# Altium footprint library 封装库.PcbLib: 755 footprints (part 31 of 48)
Each footprint in its own frame and in the unit in brackets; x right, y up, seen from the top. Pads: shape width x height; smd on the part's side, far side on the other; paste and mask are expansions set on the pad; w line width, h text height; cw(c..) or ccw(c..) is an arc to the next point about the centre after c.
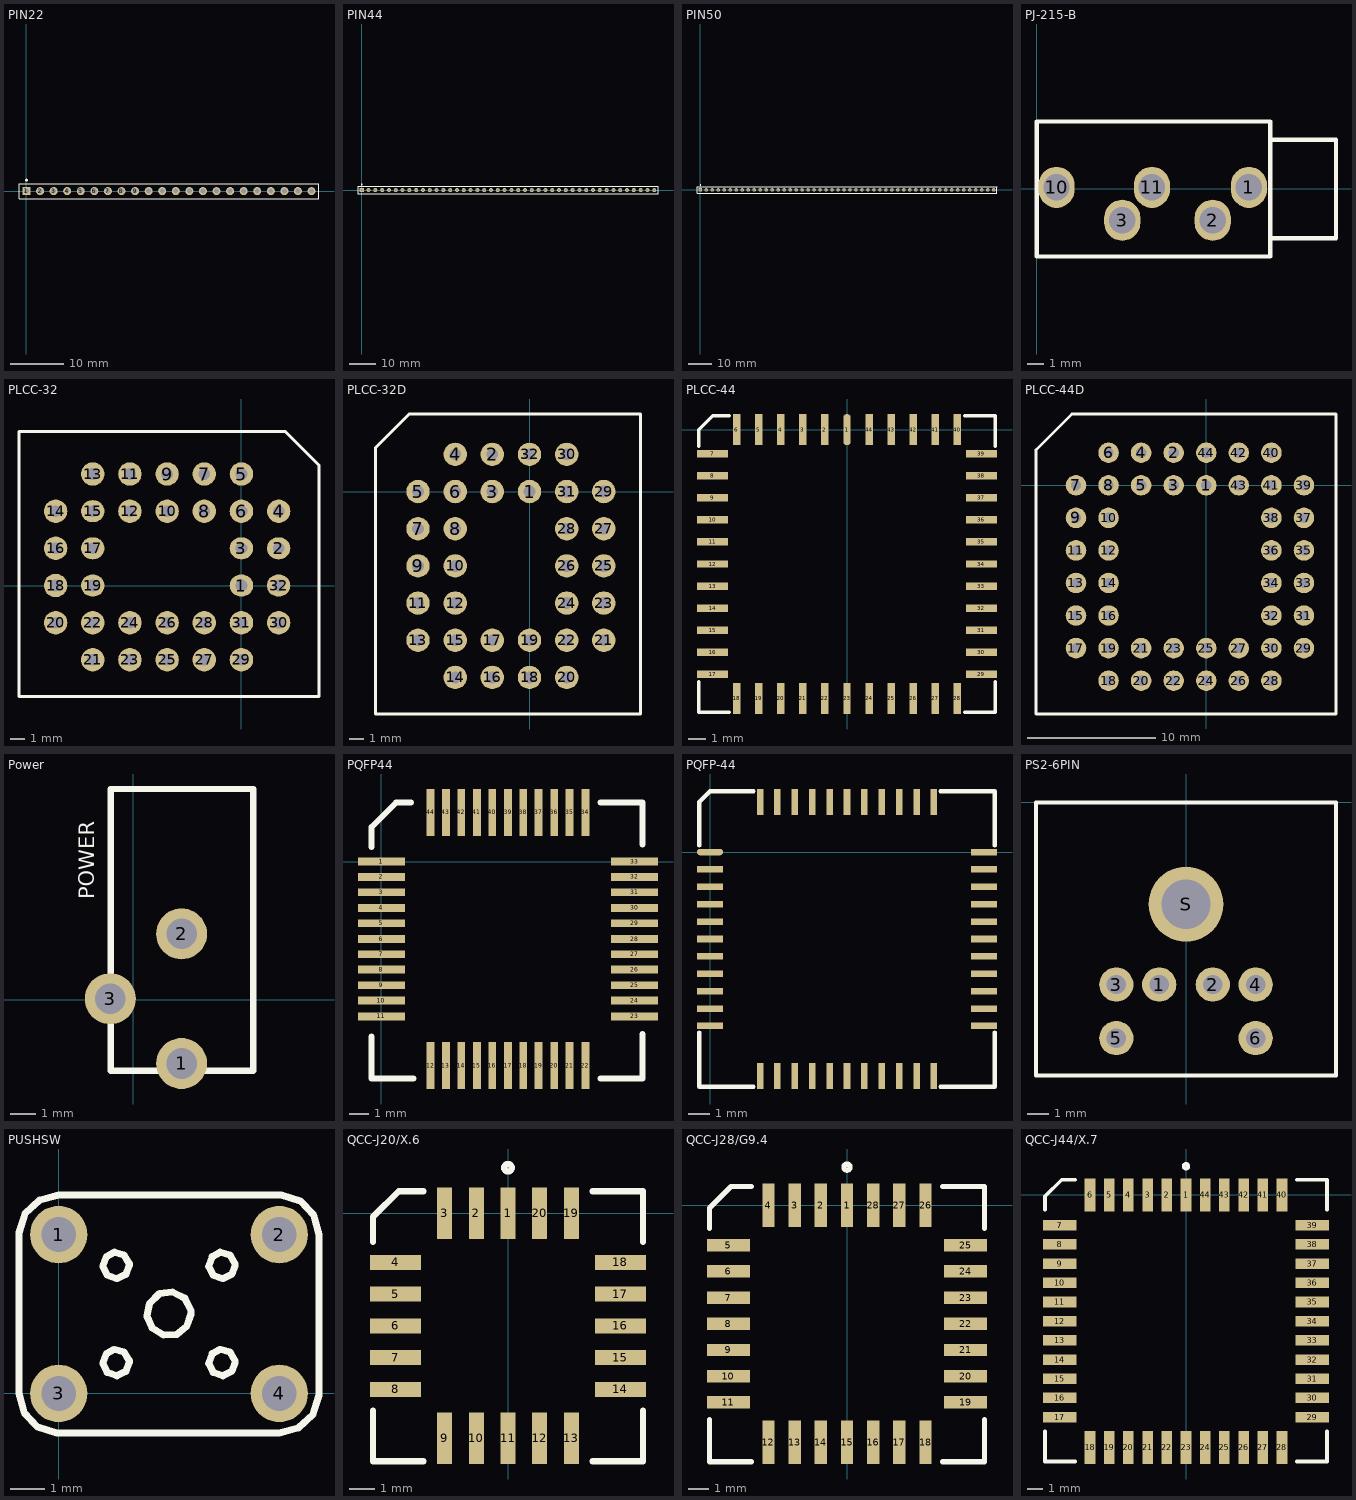
[diagram p30: the footprints below, top view; thin cyan lines are the x and y axes]

## PIN22 [mm] "Connector; Edge; 22 Position"
pads (22):
  rect 1.5x1.5 hole 0.9: 1(0,0)
  round 1.5 hole 0.9: 2(2.54,0) 3(5.08,0) 4(7.62,0) 5(10.16,0) 6(12.7,0) 7(15.24,0) 8(17.78,0) 10(22.86,0) 11(25.4,0) 12(27.94,0) 13(30.48,0) 14(33.02,0) 15(35.56,0) 16(38.1,0) 17(40.64,0) 18(43.18,0) 19(45.72,0) 20(48.26,0) 21(50.8,0) 22(53.34,0)
  oval 1.51x1.5 hole 0.9: 9(20.32,0)
Top Overlay:
  circle w0.25: c0,2.05 r0.125
  lines w0.2: -1.4,-1.4 54.74,-1.4 54.74,1.4 -1.4,1.4 -1.4,-1.4

## PIN44 [mm] "Connector; Edge; 44 Position"
pads (44):
  rect 1.5x1.5 hole 0.9: 1(0,0)
  round 1.5 hole 0.9: 2(2.54,0) 3(5.08,0) 4(7.62,0) 5(10.16,0) 6(12.7,0) 7(15.24,0) 8(17.78,0) 10(22.86,0) 11(25.4,0) 12(27.94,0) 13(30.48,0) 14(33.02,0) 15(35.56,0) 16(38.1,0) 17(40.64,0) 18(43.18,0) 19(45.72,0) 20(48.26,0) 21(50.8,0) 22(53.34,0) 23(55.88,0) 24(58.42,0) 25(60.96,0) 26(63.5,0) 27(66.04,0) 28(68.58,0) 29(71.12,0) 30(73.66,0) 31(76.2,0) 32(78.74,0) 33(81.28,0) 34(83.82,0) 35(86.36,0) 36(88.9,0) 37(91.44,0) 38(93.98,0) 39(96.52,0) 40(99.06,0) 41(101.6,0) 42(104.14,0) 43(106.68,0) 44(109.22,0)
  oval 1.51x1.5 hole 0.9: 9(20.32,0)
Top Overlay:
  circle w0.25: c0,2.05 r0.125
  lines w0.2: -1.4,-1.4 110.62,-1.4 110.62,1.4 -1.4,1.4 -1.4,-1.4

## PIN50 [mm] "Connector; Edge; 50 Position"
pads (50):
  rect 1.5x1.5 hole 0.9: 1(0,0)
  round 1.5 hole 0.9: 2(2.54,0) 3(5.08,0) 4(7.62,0) 5(10.16,0) 6(12.7,0) 7(15.24,0) 8(17.78,0) 9(20.32,0) 10(22.86,0) 11(25.4,0) 12(27.94,0) 13(30.48,0) 14(33.02,0) 15(35.56,0) 16(38.1,0) 17(40.64,0) 18(43.18,0) 19(45.72,0) 20(48.26,0) 22(53.34,0) 23(55.88,0) 24(58.42,0) 25(60.96,0) 26(63.5,0) 27(66.04,0) 28(68.58,0) 29(71.12,0) 30(73.66,0) 31(76.2,0) 32(78.74,0) 33(81.28,0) 34(83.82,0) 35(86.36,0) 36(88.9,0) 37(91.44,0) 38(93.98,0) 39(96.52,0) 40(99.06,0) 41(101.6,0) 42(104.14,0) 43(106.68,0) 44(109.22,0) 45(111.76,0) 46(114.3,0) 47(116.84,0) 48(119.38,0) 49(121.92,0) 50(124.46,0)
  oval 1.51x1.5 hole 0.9: 21(50.8,0)
Top Overlay:
  circle w0.25: c0,2.05 r0.125
  lines w0.2: -1.4,-1.4 -1.4,1.4 125.86,1.4 125.86,-1.4 -1.4,-1.4

## PJ-215-B [mm]
pads (5):
  oval 2.2x2.5 hole 1.6: 1(12.907,0.089) 2(10.707,-1.911) 3(5.207,-1.911) 10(1.207,0.089) 11(7.007,0.089)
Top Overlay:
  lines w0.254: 14.207,-3.011 18.207,-3.011 18.207,2.989 14.207,2.989 ; 0.007,-4.111 0.007,4.089 14.207,4.089 14.207,-4.111 0.007,-4.111

## PLCC-32 [mm]
pads (32):
  oval 1.6x1.5 hole 0.8: 1(0,0) 2(2.54,2.54) 3(0,2.54) 15(-10.16,5.08) 17(-10.16,2.54) 19(-10.16,0) 32(2.54,0)
  round 1.6 hole 0.8: 4(2.54,5.08) 5(0,7.62) 6(0,5.08) 7(-2.54,7.62) 8(-2.54,5.08) 9(-5.08,7.62) 10(-5.08,5.08) 11(-7.62,7.62) 12(-7.62,5.08) 13(-10.16,7.62) 14(-12.7,5.08) 16(-12.7,2.54) 18(-12.7,0) 20(-12.7,-2.54) 21(-10.16,-5.08) 22(-10.16,-2.54) 23(-7.62,-5.08) 24(-7.62,-2.54) 25(-5.08,-5.08) 26(-5.08,-2.54) 27(-2.54,-5.08) 28(-2.54,-2.54) 29(0,-5.08) 30(2.54,-2.54) 31(0,-2.54)
Top Overlay:
  lines w0.2: -15.2,-7.58 -15.2,10.52 3,10.52 3.1,10.42 5.3,8.22 5.3,-7.58 -15.2,-7.58

## PLCC-32D [mm]
pads (32):
  round 1.6 hole 0.8: 1(0,0) 2(-2.54,2.54) 3(-2.54,0) 4(-5.08,2.54) 5(-7.62,0) 6(-5.08,0) 7(-7.62,-2.54) 8(-5.08,-2.54) 9(-7.62,-5.08) 10(-5.08,-5.08) 11(-7.62,-7.62) 12(-5.08,-7.62) 13(-7.62,-10.16) 14(-5.08,-12.7) 15(-5.08,-10.16) 16(-2.54,-12.7) 17(-2.54,-10.16) 18(0,-12.7) 19(0,-10.16) 20(2.54,-12.7) 21(5.08,-10.16) 22(2.54,-10.16) 23(5.08,-7.62) 24(2.54,-7.62) 25(5.08,-5.08) 26(2.54,-5.08) 27(5.08,-2.54) 28(2.54,-2.54) 29(5.08,0) 30(2.54,2.54) 31(2.54,0) 32(0,2.54)
Top Overlay:
  lines w0.2: -10.52,-15.2 -10.52,3 -10.42,3.1 -8.22,5.3 7.58,5.3 7.58,-15.2 -10.52,-15.2

## PLCC-44 [mil] "stc"
pads (44):
  oval 17.01x70.87 smd: 1(0,0)
  rect 17.01x70.87 smd: 2(-50,0) 3(-100,0) 4(-150,0) 5(-200,0) 6(-250,0) 18(-250,-610) 19(-200,-610) 20(-150,-610) 21(-100,-610) 22(-50,-610) 23(0,-610) 24(50,-610) 25(100,-610) 26(150,-610) 27(200,-610) 28(250,-610) 40(250,0) 41(200,0) 42(150,0) 43(100,0) 44(50,0)
  rect 70.87x17.01 smd: 7(-305,-55) 8(-305,-105) 9(-305,-155) 10(-305,-205) 11(-305,-255) 12(-305,-305) 13(-305,-355) 14(-305,-405) 15(-305,-455) 16(-305,-505) 17(-305,-555) 29(305,-555) 30(305,-505) 31(305,-455) 32(305,-405) 33(305,-355) 34(305,-305) 35(305,-255) 36(305,-205) 37(305,-155) 38(305,-105) 39(305,-55)
Top Overlay:
  lines w7.87: -336.5,-572.01 -336.5,-641.5 -267.01,-641.5 ; -336.5,-37.99 -336.5,0 -305,31.5 -267.01,31.5 ; 267.01,-641.5 336.5,-641.5 336.5,-572.01 ; 267.01,31.5 336.5,31.5 336.5,-37.99

## PLCC-44D [mm]
pads (44):
  round 1.6 hole 0.8: 1(0,0) 2(-2.54,2.54) 3(-2.54,0) 4(-5.08,2.54) 5(-5.08,0) 6(-7.62,2.54) 7(-10.16,0) 8(-7.62,0) 9(-10.16,-2.54) 10(-7.62,-2.54) 11(-10.16,-5.08) 12(-7.62,-5.08) 13(-10.16,-7.62) 14(-7.62,-7.62) 15(-10.16,-10.16) 16(-7.62,-10.16) 17(-10.16,-12.7) 18(-7.62,-15.24) 19(-7.62,-12.7) 20(-5.08,-15.24) 21(-5.08,-12.7) 22(-2.54,-15.24) 23(-2.54,-12.7) 24(0,-15.24) 25(0,-12.7) 26(2.54,-15.24) 27(2.54,-12.7) 28(5.08,-15.24) 29(7.62,-12.7) 30(5.08,-12.7) 31(7.62,-10.16) 32(5.08,-10.16) 33(7.62,-7.62) 34(5.08,-7.62) 35(7.62,-5.08) 36(5.08,-5.08) 37(7.62,-2.54) 38(5.08,-2.54) 39(7.62,0) 40(5.08,2.54) 41(5.08,0) 42(2.54,2.54) 43(2.54,0) 44(0,2.54)
Top Overlay:
  lines w0.2: -13.28,-17.84 -13.28,2.76 -10.48,5.56 10.12,5.56 10.12,-17.84 -13.28,-17.84

## Power [mm]
height 1.73
pads (3):
  round 2 hole 1.2: 1(1.893,-2.503) 2(1.893,2.577) 3(-0.901,0.037)
Bottom Layer:
  lines w0.2: 1.67,-2.28 1.893,-2.503
Top Overlay:
  lines w0.254: -0.889,-2.794 4.699,-2.794 4.699,8.255 -0.889,8.255 -0.889,-2.794
  text "POWER" at -1.524,3.937 h0.6

## PQFP44 [mil]
pads (44):
  rect 95x16 smd: 1(0,0) 2(0,-31) 3(0,-62) 4(0,-94) 5(0,-125) 6(0,-157) 7(0,-188) 8(0,-219) 9(0,-251) 10(0,-282) 11(0,-314) 23(514,-314) 24(514,-282) 25(514,-251) 26(514,-219) 27(514,-188) 28(514,-157) 29(514,-125) 30(514,-94) 31(514,-62) 32(514,-31) 33(514,0)
  rect 16x95 smd: 12(100,-414) 13(131,-414) 14(162,-414) 15(194,-414) 16(225,-414) 17(257,-414) 18(288,-414) 19(319,-414) 20(351,-414) 21(382,-414) 22(414,-414) 34(414,100) 35(382,100) 36(351,100) 37(319,100) 38(288,100) 39(257,100) 40(225,100) 41(194,100) 42(162,100) 43(131,100) 44(100,100)
Top Overlay:
  lines w12: -20,-355 -20,-440 65,-440 ; -20,30 -20,70 30,120 60,120 ; 445,-440 530,-440 530,-350 ; 445,120 530,120 530,35

## PQFP-44 [mm] "stc"
pads (44):
  oval 1.2x0.3 smd: 1(0,0)
  rect 1.2x0.3 smd: 2(0,-0.8) 3(0,-1.6) 4(0,-2.4) 5(0,-3.2) 6(0,-4) 7(0,-4.8) 8(0,-5.6) 9(0,-6.4) 10(0,-7.2) 11(0,-8) 23(12.6,-8) 24(12.6,-7.2) 25(12.6,-6.4) 26(12.6,-5.6) 27(12.6,-4.8) 28(12.6,-4) 29(12.6,-3.2) 30(12.6,-2.4) 31(12.6,-1.6) 32(12.6,-0.8) 33(12.6,0)
  rect 0.3x1.2 smd: 12(2.3,-10.3) 13(3.1,-10.3) 14(3.9,-10.3) 15(4.7,-10.3) 16(5.5,-10.3) 17(6.3,-10.3) 18(7.1,-10.3) 19(7.9,-10.3) 20(8.7,-10.3) 21(9.5,-10.3) 22(10.3,-10.3) 34(10.3,2.3) 35(9.5,2.3) 36(8.7,2.3) 37(7.9,2.3) 38(7.1,2.3) 39(6.3,2.3) 40(5.5,2.3) 41(4.7,2.3) 42(3.9,2.3) 43(3.1,2.3) 44(2.3,2.3)
Top Overlay:
  lines w0.2: -0.5,-8.3 -0.5,-10.8 2,-10.8 ; -0.5,0.3 -0.5,2.3 0,2.8 2,2.8 ; 10.6,-10.8 13.1,-10.8 13.1,-8.3 ; 10.6,2.8 13.1,2.8 13.1,0.3

## PS2-6PIN [mm] "PS2 Socket, 6 Pin, Through Hole"
pads (7):
  round 1.6 hole 0.9: 1(-1.25,-8.5) 2(1.25,-8.5) 3(-3.25,-8.5) 4(3.25,-8.5) 5(-3.25,-11) 6(3.25,-11)
  round 3.5 hole 2.3: S(0,-4.75)
Top Overlay:
  lines w0.2: -7,-12.75 7,-12.75 7,0 -7,0 -7,-12.75

## PUSHSW [mil]
pads (4):
  round 65 hole 39.37: 1(0.06,179.65) 2(250.06,179.65) 3(0.06,-0.35) 4(250.06,-0.35)
Top Overlay:
  lines w8: -44.94,-0.35 -38.94,-22.35 -23.94,-38.35 -1.94,-45.35 0.06,-45.35 250.06,-45.35 272.06,-39.35 288.06,-24.35 295.06,-2.35 295.06,-0.35 295.06,179.65 289.06,201.65 274.06,217.65 252.06,224.65 250.06,224.65 0.06,224.65 -21.94,218.65 -37.94,203.65 -44.94,181.65 -44.94,179.65 -44.94,-0.35 ; 50.06,33.65 55.06,23.65 66.06,19.65 76.06,24.65 80.06,34.65 80.06,36.65 74.06,46.65 63.06,49.65 54.06,44.65 50.06,33.65 ; 50.06,143.65 55.06,133.65 66.06,129.65 76.06,134.65 80.06,144.65 80.06,146.65 74.06,156.65 63.06,159.65 54.06,154.65 50.06,143.65 ; 100.06,87.65 106.06,73.65 119.06,65.65 134.06,66.65 145.06,75.65 150.06,89.65 150.06,93.65 143.06,107.65 129.06,114.65 114.06,112.65 103.06,101.65 100.06,87.65 ; 170.06,33.65 175.06,23.65 186.06,19.65 196.06,24.65 200.06,34.65 200.06,36.65 194.06,46.65 183.06,49.65 174.06,44.65 170.06,33.65 ; 170.06,143.65 175.06,133.65 186.06,129.65 196.06,134.65 200.06,144.65 200.06,146.65 194.06,156.65 183.06,159.65 174.06,154.65 170.06,143.65

## QCC-J20/X.6 [mm]
pads (20):
  rect 0.6x2.05 smd: 1(0,0) 2(-1.27,0) 3(-2.54,0) 9(-2.54,-9) 10(-1.27,-9) 11(0,-9) 12(1.27,-9) 13(2.54,-9) 19(2.54,0) 20(1.27,0)
  rect 2.05x0.6 smd: 4(-4.5,-1.96) 5(-4.5,-3.23) 6(-4.5,-4.5) 7(-4.5,-5.77) 8(-4.5,-7.04) 14(4.5,-7.04) 15(4.5,-5.77) 16(4.5,-4.5) 17(4.5,-3.23) 18(4.5,-1.96)
Top Overlay:
  circle w0.25: c0,1.825 r0.15
  lines w0.25: -5.4,-7.887 -5.4,-9.913 -3.375,-9.913 ; -5.4,-1.137 -5.4,-0.137 -4.375,0.888 -3.375,0.888 ; 3.375,-9.913 5.4,-9.913 5.4,-7.887 ; 3.375,0.888 5.4,0.888 5.4,-1.137

## QCC-J28/G9.4 [mm]
pads (28):
  rect 0.6x2.1 smd: 1(0,0) 2(-1.27,0) 3(-2.54,0) 4(-3.81,0) 12(-3.81,-11.5) 13(-2.54,-11.5) 14(-1.27,-11.5) 15(0,-11.5) 16(1.27,-11.5) 17(2.54,-11.5) 18(3.81,-11.5) 26(3.81,0) 27(2.54,0) 28(1.27,0)
  rect 2.1x0.6 smd: 5(-5.75,-1.94) 6(-5.75,-3.21) 7(-5.75,-4.48) 8(-5.75,-5.75) 9(-5.75,-7.02) 10(-5.75,-8.29) 11(-5.75,-9.56) 19(5.75,-9.56) 20(5.75,-8.29) 21(5.75,-7.02) 22(5.75,-5.75) 23(5.75,-4.48) 24(5.75,-3.21) 25(5.75,-1.94)
Top Overlay:
  circle w0.25: c0,1.85 r0.15
  lines w0.25: -6.675,-10.407 -6.675,-12.437 -4.645,-12.437 ; -6.675,-1.117 -6.675,-0.137 -5.625,0.912 -4.645,0.912 ; 4.645,-12.437 6.675,-12.437 6.675,-10.407 ; 4.645,0.912 6.675,0.912 6.675,-1.117

## QCC-J44/X.7 [mm]
pads (44):
  rect 0.7x2.2 smd: 1(0,0) 2(-1.27,0) 3(-2.54,0) 4(-3.81,0) 5(-5.08,0) 6(-6.35,0) 18(-6.35,-16.7) 19(-5.08,-16.7) 20(-3.81,-16.7) 21(-2.54,-16.7) 22(-1.27,-16.7) 23(0,-16.7) 24(1.27,-16.7) 25(2.54,-16.7) 26(3.81,-16.7) 27(5.08,-16.7) 28(6.35,-16.7) 40(6.35,0) 41(5.08,0) 42(3.81,0) 43(2.54,0) 44(1.27,0)
  rect 2.2x0.7 smd: 7(-8.35,-2) 8(-8.35,-3.27) 9(-8.35,-4.54) 10(-8.35,-5.81) 11(-8.35,-7.08) 12(-8.35,-8.35) 13(-8.35,-9.62) 14(-8.35,-10.89) 15(-8.35,-12.16) 16(-8.35,-13.43) 17(-8.35,-14.7) 29(8.35,-14.7) 30(8.35,-13.43) 31(8.35,-12.16) 32(8.35,-10.89) 33(8.35,-9.62) 34(8.35,-8.35) 35(8.35,-7.08) 36(8.35,-5.81) 37(8.35,-4.54) 38(8.35,-3.27) 39(8.35,-2)
Top Overlay:
  circle w0.25: c0,1.9 r0.15
  lines w0.25: -9.325,-15.647 -9.325,-17.638 -7.335,-17.638 ; -9.325,-0.977 -9.325,-0.088 -8.225,1.012 -7.335,1.012 ; 7.335,-17.638 9.325,-17.638 9.325,-15.647 ; 7.335,1.012 9.325,1.012 9.325,-0.977